# Altium footprint library My_lib.PcbLib: 63 footprints (part 1 of 4)
Each footprint in its own frame and in the unit in brackets; x right, y up, seen from the top. Pads: shape width x height; smd on the part's side, far side on the other; paste and mask are expansions set on the pad; w line width, h text height; cw(c..) or ccw(c..) is an arc to the next point about the centre after c.
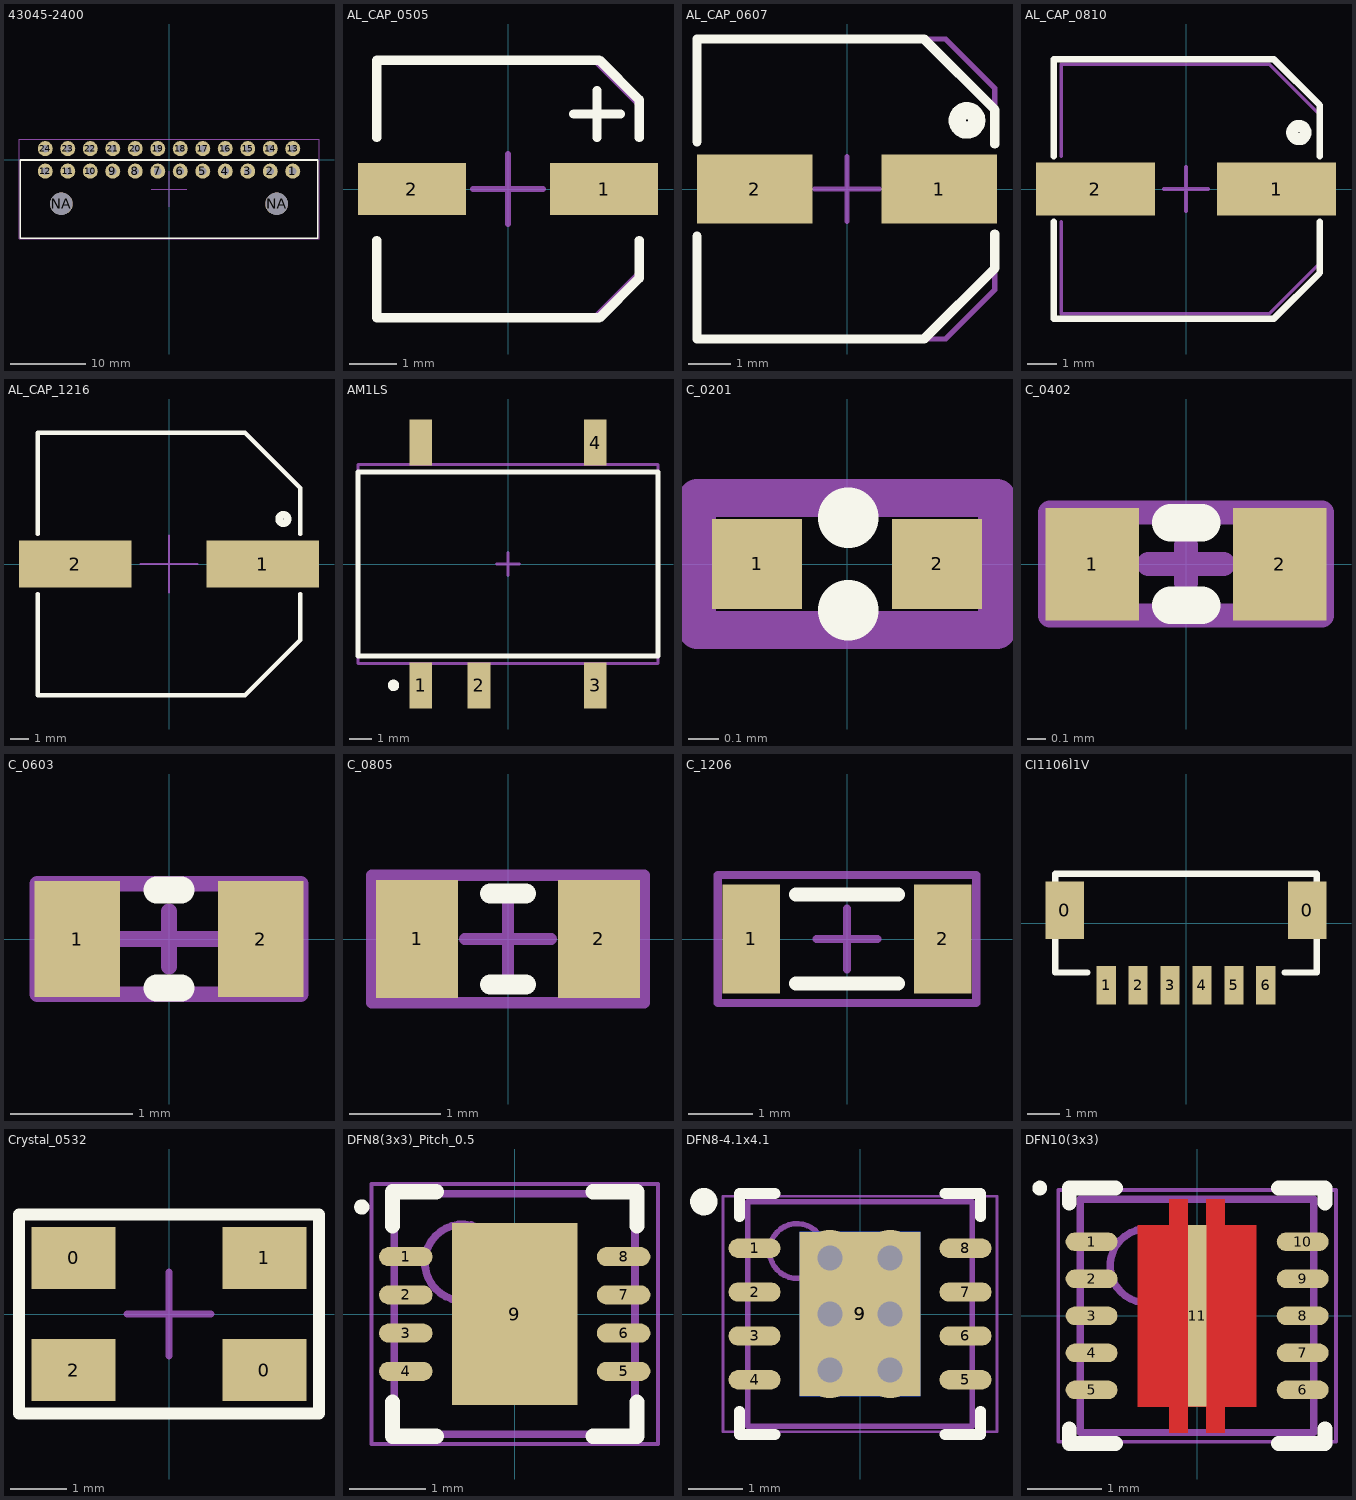
[diagram p0: the footprints below, top view; thin cyan lines are the x and y axes]

## 43045-2400 [mm] "43045-2400 Molex Connector"
height 8.8
pads (26):
  round 2 hole 1: 1(16.5,-1.5) 2(13.5,-1.5) 3(10.5,-1.5) 4(7.5,-1.5) 5(4.5,-1.5) 6(1.5,-1.5) 7(-1.5,-1.5) 8(-4.5,-1.5) 9(-7.5,-1.5) 10(-10.5,-1.5) 11(-13.5,-1.5) 12(-16.5,-1.5) 13(16.5,1.5) 14(13.5,1.5) 15(10.5,1.5) 16(7.5,1.5) 17(4.5,1.5) 18(1.5,1.5) 19(-1.5,1.5) 20(-4.5,1.5) 21(-7.5,1.5) 22(-10.5,1.5) 23(-13.5,1.5) 24(-16.5,1.5)
  round 3 hole 3: NA(-14.35,-5.85) NA(14.35,-5.85)
Top Overlay:
  lines w0.22: -19.85,-10.45 19.85,-10.45 19.85,0 -19.85,0 -19.85,-10.45
Top_Assy:
  lines w0.127: -2.375,-3.875 0,-3.875 ; 0,-6.25 0,-3.875 ; 0,-1.5 0,-3.875 ; 2.375,-3.875 0,-3.875 ; -20,-10.5 -20,2.75 20,2.75 20,-10.5 -20,-10.5
3D body: height 8.75, standoff -3.19, extent -20.075,-10.425 20.075,1.815

## AL_CAP_0505 [mm] "Aluminium Cap ¦5.4mm"
height 5.4
pads (2):
  rect 2.3x1.1 smd: 1(2.05,0) 2(-2.05,0)
Top Overlay:
  lines w0.2: -2.8,-1.1 -2.8,-2.75 1.95,-2.75 2.8,-1.9 2.8,-1.1 ; -2.8,1.1 -2.8,2.75 1.95,2.75 2.8,1.9 2.8,1.1 ; 1.4,1.6 2.4,1.6 ; 1.9,1.1 1.9,2.1
Top_Assy:
  lines w0.127: -2.8,-1.1 -2.8,-2.75 1.85,-2.75 2.8,-1.8 2.8,-1.1 ; -2.8,1.1 -2.8,2.75 1.85,2.75 2.8,1.8 2.8,1.1 ; -0.75,0 0,0 ; 0,-0.75 0,0 ; 0,0.75 0,0 ; 0.75,0 0,0
3D body: height 5.7, standoff 0, extent -3.15,-2.65 3.15,2.65

## AL_CAP_0607 [mm] "Aluminium Cap ¦6.6mm"
height 7.8
pads (2):
  rect 2.7x1.6 smd: 1(2.15,0) 2(-2.15,0)
Top Overlay:
  circle w0.4: c2.8,1.6 r0.227
  lines w0.22: -3.5,-1.1 -3.5,-3.5 1.8,-3.5 3.45,-1.85 3.45,-1.05 ; -3.5,1.1 -3.5,3.5 1.8,3.5 3.45,1.85 3.45,1.05
Top_Assy:
  lines w0.127: -3.5,-1.125 -3.5,-2.025 -3.5,-3.5 2.3,-3.5 3.45,-2.35 3.45,-1.05 ; -3.5,1.125 -3.5,2.025 -3.5,3.5 2.3,3.5 3.45,2.35 3.45,1.05 ; -0.75,0 0,0 ; 0,-0.75 0,0 ; 0,0.75 0,0 ; 0.75,0 0,0
3D body: height 8.11, standoff 0, extent -3.5,-3.3 3.5,3.3

## AL_CAP_0810 [mm] "Aluminium Cap ¦10mm"
height 10
pads (2):
  rect 4x1.8 smd: 1(3.05,0) 2(-3.05,0)
Top Overlay:
  circle w0.4: c3.8,1.9 r0.227
  lines w0.22: -4.45,-1.1 -4.45,-4.375 2.95,-4.375 4.5,-2.825 4.5,-1.1 ; -4.45,1.1 -4.45,4.375 2.95,4.375 4.5,2.825 4.5,1.1
Top_Assy:
  lines w0.127: -4.2,-1.1 -4.2,-4.2 2.6,-4.2 2.8,-4.2 4.5,-2.5 4.5,-1.1 ; -4.2,1.1 -4.2,4.2 2.6,4.2 2.8,4.2 4.5,2.5 4.5,1.1 ; -0.75,0 0,0 ; 0,-0.75 0,0 ; 0,0.75 0,0 ; 0.75,0 0,0
3D body: height 10.3, standoff -0.2, extent -4.848,-4.25 4.852,4.25

## AL_CAP_1216 [mm] "Aluminium Cap ¦13.6mm"
height 16
pads (2):
  rect 6x2.5 smd: 1(5,0) 2(-5,0)
Top Overlay:
  circle w0.4: c6.1,2.4 r0.227
  lines w0.22: -7,-1.6 -7,-7 4.05,-7 7,-4.05 7,-1.6 ; -7,1.6 -7,7 4.05,7 7,4.05 7,1.6
Top_Assy:
  lines w0.127: -1.5,0 0,0 ; 0,-1.5 0,0 ; 0,1.5 0,0 ; 1.5,0 0,0
  lines w0.2: -7,-1.6 -7,-7 4.05,-7 7,-4.05 7,-1.6 ; -7,1.6 -7,7 4.05,7 7,4.05 7,1.6
3D body: height 17, standoff 0, extent -7.75,-6.85 7.75,6.85

## AM1LS [mm] "SOT23, 6-Leads, Body 2.9x1.6mm, Pitch 0.95mm, Lead Span 2.7mm, IPC Medium Density"
height 7.25
pads (5):
  rect 1x2 smd: 1(-3.81,-5.3) 2(-1.27,-5.3) 3(3.81,-5.3) 4(3.81,5.3) ""(-3.81,5.3)
Top Overlay:
  circle w0.25: c-5,-5.3 r0.125
  lines w0.22: -6.55,-4.025 6.55,-4.025 6.55,4.025 -6.55,4.025 -6.55,-4.025
Top_Assy:
  lines w0.127: -0.5,0 0.5,0 ; 0,-0.5 0,0.5 ; -6.55,-4.35 6.55,-4.35 ; -6.55,-4.35 -6.55,4.35 ; -6.55,-4.35 6.55,-4.35 ; -6.55,-4.35 -6.55,4.35 ; -6.55,4.35 6.55,4.35 ; -6.55,4.35 6.55,4.35 ; 6.55,-4.35 6.55,4.35 ; 6.55,-4.35 6.55,4.35
3D body: height 6.24, standoff -0.01, extent -6.35,-5.6 6.35,5.6

## C_0201 [mm] "Chip, Body 0.6x0.3mm, IPC High Density"
height 0.23
pads (2):
  rect 0.3x0.3 smd mask+0.05: 1(-0.3,0) 2(0.3,0)
Top Overlay:
  circle w0.2: c0.005,0.154 r0.001
  circle w0.2: c0.005,-0.154 r0.001
Top_Assy:
  lines w0.127: -0.5,-0.22 -0.5,0.22 0.5,0.22 0.5,-0.22 -0.5,-0.22
3D body: height 0.29, standoff -0.01, extent -0.3,-0.154 0.31,0.154

## C_0402 [mm] "Chip, Body 1.6x0.85mm, IPC High Density"
height 0.9
pads (2):
  rect 0.5x0.6 smd mask+0.05: 1(-0.5,0) 2(0.5,0)
Top Overlay:
  lines w0.2: -0.083,-0.22 0.083,-0.22 ; -0.083,0.22 0.083,0.22
Top_Assy:
  lines w0.127: -0.2,0 0.2,0 ; 0,-0.1 0,0.1 ; -0.725,-0.275 -0.725,0.275 0.725,0.275 0.725,-0.275 -0.725,-0.275
3D body: height 0.2, standoff 0, extent -0.5,-0.3 0.5,0.3

## C_0603 [mm] "Chip, Body 1.6x0.85mm, IPC High Density"
height 0.9
pads (2):
  rect 0.7x0.95 smd mask+0.05: 1(-0.75,0) 2(0.75,0)
Top Overlay:
  lines w0.22: -0.1,-0.4 0.1,-0.4 ; -0.1,0.4 0.1,0.4
Top_Assy:
  lines w0.127: -0.4,0 0.4,0 ; 0,-0.225 0,0.225 ; -1.075,-0.45 1.075,-0.45 1.075,0.45 -1.075,0.45 -1.075,-0.45
3D body: height 0.3, standoff 0, extent -0.8,-0.4 0.8,0.4

## C_0805 [mm] "Chip, Body 1.6x0.85mm, IPC High Density"
height 0.45
pads (2):
  rect 0.9x1.3 smd: 1(-1,0) 2(1,0)
Top Overlay:
  lines w0.22: -0.2,-0.5 0.2,-0.5 ; -0.2,0.5 0.2,0.5
Top_Assy:
  lines w0.127: -0.475,0 0.475,0 ; 0,-0.475 0,0.475 ; -1.5,-0.7 1.5,-0.7 1.5,0.7 -1.5,0.7 -1.5,-0.7
3D body: height 0.78, standoff 0, extent -1,-0.625 1,0.625

## C_1206 [mm] "Chip, Body 3.2x1.6mm, IPC High Density"
height 0.5
pads (2):
  rect 0.9x1.7 smd: 1(-1.5,0) 2(1.5,0)
Top Overlay:
  lines w0.22: -0.8,-0.7 0.8,-0.7 ; -0.8,0.7 0.8,0.7
Top_Assy:
  lines w0.127: -0.475,0 0.475,0 ; 0,-0.475 0,0.475 ; -2.025,-1 -2.025,1 2.025,1 2.025,-1 -2.025,-1
3D body: height 1, standoff 0, extent -1.6,-0.8 1.6,0.8

## CI1106Ì1V [mm] "ÑI1106Ì1V - 6 pin SMD connector, 1 mm pitch"
height 4.25
pads (8):
  rect 1.2x1.8 smd: 0(-3.8,0.4) 0(3.8,0.4)
  rect 0.6x1.2 smd: 1(-2.5,-1.95) 2(-1.5,-1.95) 3(-0.5,-1.95) 4(0.5,-1.95) 5(1.5,-1.95) 6(2.5,-1.95)
Top Overlay:
  lines w0.2: -3.1,-1.55 -4.1,-1.55 -4.1,1.55 4.1,1.55 ; 3.1,-1.55 4.1,-1.55 4.1,1.55 ; 4,1.55 4.1,1.55
3D body: height 4.25, standoff 0, extent -4,-2.2 4,1.4

## Crystal_0532 [mm]
height 1.5
pads (4):
  rect 1.5x1.1 smd: 0(-1.7,1) 0(1.7,-1) 1(1.7,1) 2(-1.7,-1)
Top Overlay:
  lines w0.22: -2.675,-1.775 2.675,-1.775 2.675,1.775 -2.675,1.775 -2.675,-1.775
Top_Assy:
  lines w0.127: -0.75,0 0,0 ; 0,-0.75 0,0 ; 0,0.75 0,0 ; 0.75,0 0,0 ; -2.65,-1.75 2.65,-1.75 2.65,1.75 -2.65,1.75 -2.65,-1.75
3D body: height 1, standoff 0, extent -2.5,-1.6 2.5,1.6

## DFN8(3x3)_Pitch_0.5 [mm] "SON, 8-Leads, Body 3x3mm, Pitch 0.5mm, Thermal Pad 2.38x1.64mm, IPC High Density"
height 1
pads (9):
  oval 0.7x0.25 smd: 1(-1.425,0.75) 2(-1.425,0.25) 3(-1.425,-0.25) 4(-1.425,-0.75) 5(1.425,-0.75) 6(1.425,-0.25) 7(1.425,0.25) 8(1.425,0.75)
  rect 1.64x2.38 smd paste-0.82: 9(0,0)
Top Overlay:
  circle w0.1: c-2,1.4 r0.05
  lines w0.2: -1.6,-1.15 -1.6,-1.6 -1.025,-1.6 ; -1.6,1.15 -1.6,1.6 -1.025,1.6 ; 1.025,-1.6 1.6,-1.6 1.6,-1.15 ; 1.025,1.6 1.6,1.6 1.6,1.15
Top Paste:
  rectangle: -0.725,0.1 0.725,0.525
  rectangle: -0.725,0.725 0.725,1.15
  rectangle: -0.725,-0.525 0.725,-0.1
  rectangle: -0.725,-1.15 0.725,-0.725
Top_Assy:
  circle w0.1: c-0.675,0.675 r0.5
  lines w0.1: -1.575,-1.575 -1.575,1.575 1.575,1.575 1.575,-1.575 -1.575,-1.575
Mechanical 15:
  lines w0.05: -1.875,-1.7 -1.875,1.7 1.875,1.7 1.875,-1.7 -1.875,-1.7
  lines w0.1: -0.5,0 0.5,0 ; 0,-0.5 0,0.5
3D body: height 0.8, standoff 0, extent -1.51,-1.5 1.51,1.5

## DFN8-4.1x4.1 [mm] "SON, 8-Leads, Body 4x4mm, Pitch 0.8mm, Thermal Pad 3x2.2mm, TI Recommended"
height 0.8
pads (10):
  oval 0.95x0.35 smd paste-0.025 mask+0.07: 1(-1.925,1.2) 2(-1.925,0.4) 3(-1.925,-0.4) 4(-1.925,-1.2) 5(1.925,-1.2) 6(1.925,-0.4) 7(1.925,0.4) 8(1.925,1.2)
  rect 2.2x3 smd paste-1.1 mask+0.07: 9(0,0)
  rect 2.2x3 smd far side paste-1.1 mask+0.07: 9(0,0)
via -0.55,1.025 diameter 1.016 hole 0.457
via 0.55,-1.025 diameter 1.016 hole 0.457
via -0.55,-1.025 diameter 1.016 hole 0.457
via 0.55,0 diameter 1.016 hole 0.457
via -0.55,0 diameter 1.016 hole 0.457
via 0.55,1.025 diameter 1.016 hole 0.457
Top Overlay:
  circle w0.25: c-2.85,2.05 r0.125
  lines w0.2: -2.2,-1.775 -2.2,-2.2 -1.55,-2.2 ; -2.2,1.775 -2.2,2.2 -1.55,2.2 ; 1.55,-2.2 2.2,-2.2 2.2,-1.775 ; 1.55,2.2 2.2,2.2 2.2,1.775
Top Paste:
  rectangle: -1.05,0.15 -0.15,1.45
  region: 1.05,1.45 0.15,1.45 0.15,0.15 1.05,0.15
  region: 1.05,-0.15 0.15,-0.15 0.15,-1.45 1.05,-1.45
  rectangle: -1.05,-1.45 -0.15,-0.15
Top_Assy:
  circle w0.1: c-1.15,1.15 r0.5
  lines w0.1: -2.05,-2.05 -2.05,2.05 2.05,2.05 2.05,-2.05 -2.05,-2.05
Mechanical 15:
  lines w0.05: -2.5,-2.15 -2.5,2.15 2.5,2.15 2.5,-2.15 -2.5,-2.15
  lines w0.1: -0.5,0 0.5,0 ; 0,-0.5 0,0.5
3D body: height 0.95, standoff -0.05, extent -2.05,-2 2.05,2

## DFN10(3x3) [mm] "SON, 10-Leads, Body 3x3mm, Pitch 0.5mm, Thermal Pad 2.45x1.6mm, IPC High Density"
height 1
pads (11):
  oval 0.7x0.25 smd: 1(-1.425,1) 2(-1.425,0.5) 3(-1.425,0) 4(-1.425,-0.5) 5(-1.425,-1) 6(1.425,-1) 7(1.425,-0.5) 8(1.425,0) 9(1.425,0.5) 10(1.425,1)
  rect 0.25x2.45 smd paste+0 mask+0: 11(0,0)
Top Layer:
  region: -0.8,-1.225 -0.375,-1.225 -0.375,-1.575 -0.125,-1.575 -0.125,-1.225 0.125,-1.225 0.125,-1.575 0.375,-1.575 0.375,-1.225 0.8,-1.225 0.8,1.225 0.375,1.225 0.375,1.575 0.125,1.575 0.125,1.225 -0.125,1.225 -0.125,1.575 -0.375,1.575 -0.375,1.225 -0.8,1.225
Top Overlay:
  circle w0.1: c-2.125,1.725 r0.05
  lines w0.2: -1.725,-1.525 -1.725,-1.725 -1.1,-1.725 ; -1.725,1.525 -1.725,1.725 -1.1,1.725 ; 1.1,-1.725 1.725,-1.725 1.725,-1.525 ; 1.1,1.725 1.725,1.725 1.725,1.525
Top_Assy:
  circle w0.1: c-0.675,0.675 r0.5
  lines w0.1: -1.575,-1.575 -1.575,1.575 1.575,1.575 1.575,-1.575 -1.575,-1.575
Mechanical 15:
  lines w0.05: -1.875,-1.7 -1.875,1.7 1.875,1.7 1.875,-1.7 -1.875,-1.7
  lines w0.1: -0.5,0 0.5,0 ; 0,-0.5 0,0.5
3D body: height 0.8, standoff 0, extent -1.5,-1.5 1.5,1.5